# Altium footprint library ESKDPcbLib.PcbLib: 608 footprints (part 6 of 38)
Each footprint in its own frame and in the unit in brackets; x right, y up, seen from the top. Pads: shape width x height; smd on the part's side, far side on the other; paste and mask are expansions set on the pad; w line width, h text height; cw(c..) or ccw(c..) is an arc to the next point about the centre after c.
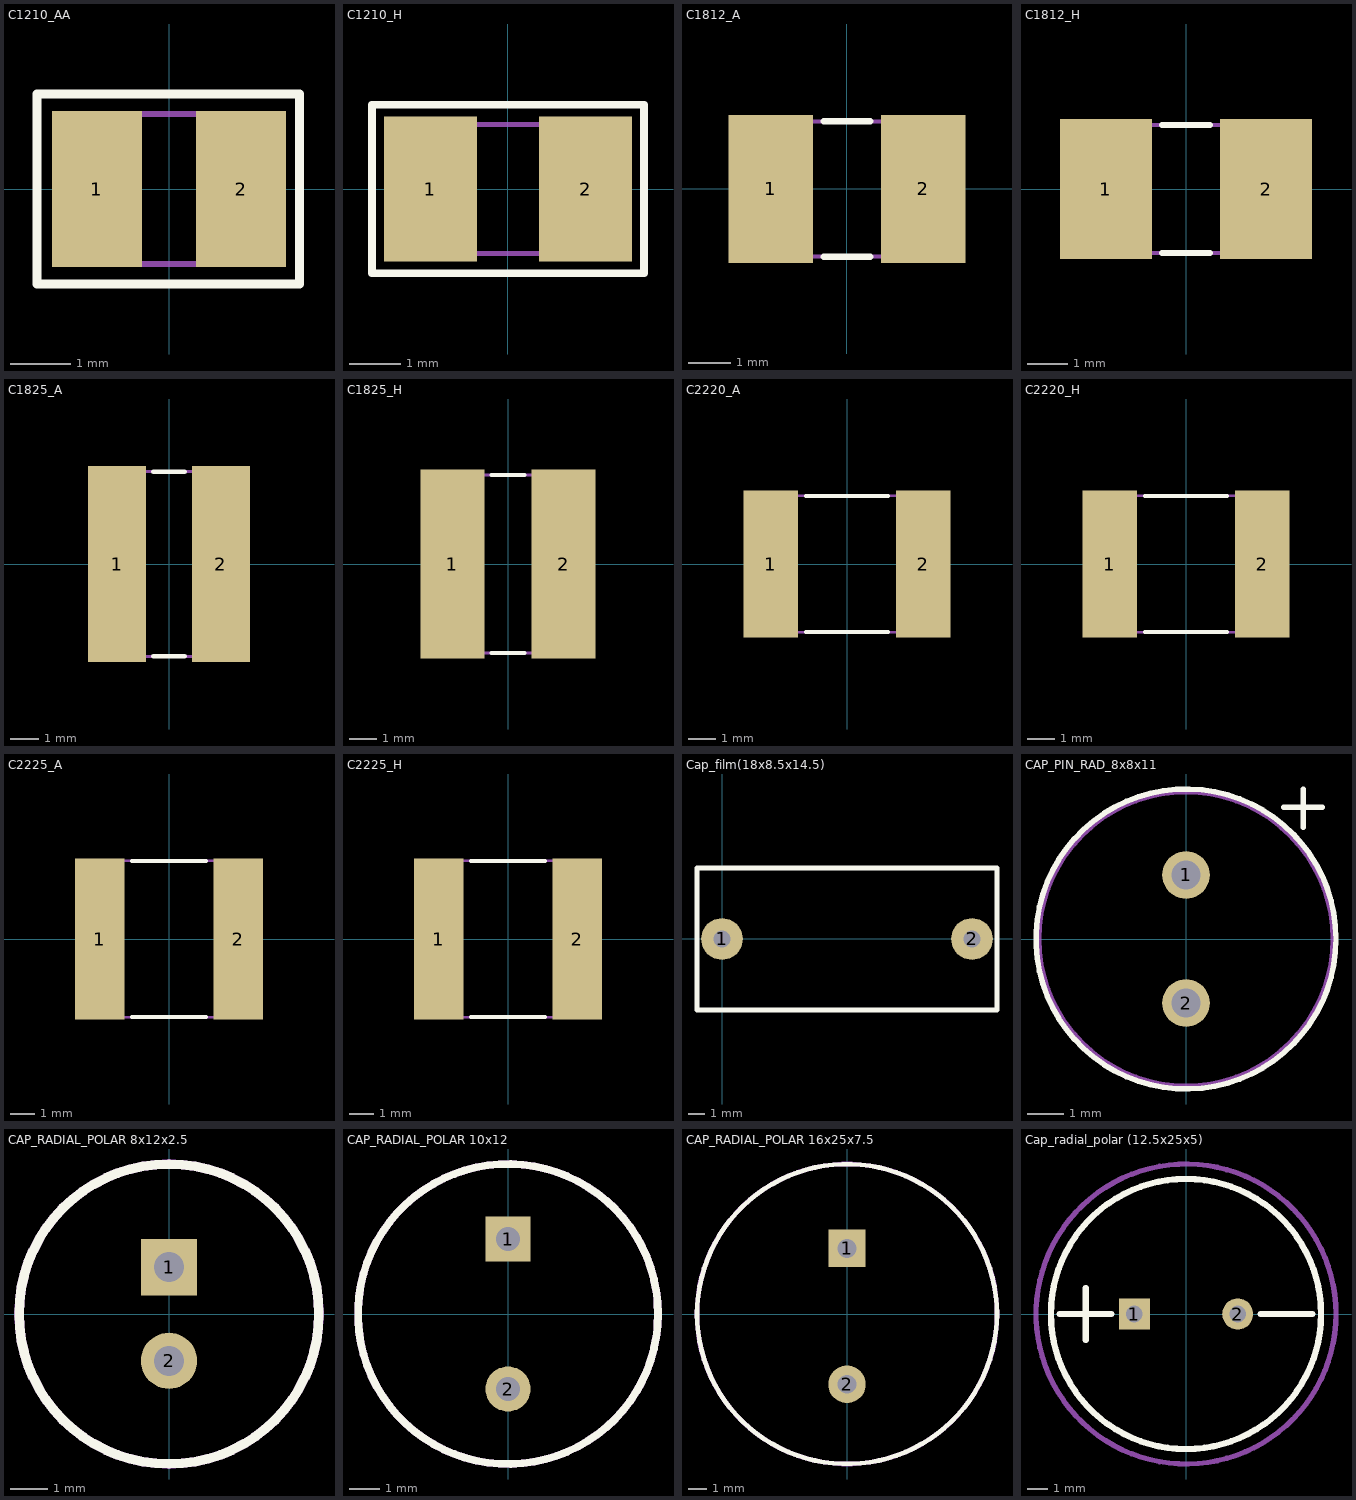
[diagram p5: the footprints below, top view; thin cyan lines are the x and y axes]

## C1210_AA [mm]
height 2.5
pads (2):
  rect 1.5x2.6 smd: 1(-1.2,0) 2(1.2,0)
Top Overlay:
  lines w0.15: -2.2,-1.58 2.175,-1.58 2.175,1.58 -2.2,1.58 -2.2,-1.58
Mechanical 7:
  lines w0.1: -1.6,-1.25 -1.6,1.25 1.6,1.25 1.6,-1.25 -1.6,-1.25
Mechanical 10:
  text ".Comment" at -0.74,-2.23 h0.6
  text ".Designator" at -0.71,1.89 h0.8
3D body: height 2.5, standoff 0, extent -1.6,-1.25 1.6,1.25

## C1210_H [mm]
height 2.5
pads (2):
  rect 1.8x2.8 smd: 1(-1.5,0) 2(1.5,0)
Top Overlay:
  lines w0.15: -2.63,-1.63 2.63,-1.63 2.63,1.63 -2.63,1.63 -2.63,-1.63
Mechanical 7:
  lines w0.1: -1.6,-1.25 -1.6,1.25 1.6,1.25 1.6,-1.25 -1.6,-1.25
Mechanical 10:
  text ".Comment" at -0.69,-2.29 h0.6
  text ".Designator" at -0.71,1.89 h0.8
3D body: height 2.5, standoff 0, extent -1.6,-1.25 1.6,1.25

## C1812_A [mm]
height 1.7
pads (2):
  rect 2x3.5 smd: 1(-1.8,0) 2(1.8,0)
Top Overlay:
  lines w0.15: -0.55,-1.6 0.55,-1.6 ; -0.55,1.6 0.55,1.6
Mechanical 7:
  lines w0.1: -2.25,-1.6 2.25,-1.6 2.25,1.6 -2.25,1.6 -2.25,-1.6
Mechanical 10:
  text ".Comment" at -0.52,-2.51 h0.6
  text ".Designator" at -0.62,2.14 h0.8
3D body "С1812.step": height 1, standoff 0, extent -2.25,-1.6 2.25,1.6

## C1812_H [mm]
height 1.7
pads (2):
  rect 2.3x3.5 smd: 1(-2,0) 2(2,0)
Top Overlay:
  lines w0.15: -0.6,-1.6 0.6,-1.6 ; -0.6,1.6 0.6,1.6
Mechanical 7:
  lines w0.1: -2.25,-1.6 -2.25,1.6 2.25,1.6 2.25,-1.6 -2.25,-1.6
Mechanical 10:
  text ".Comment" at -0.63,-2.52 h0.6
  text ".Designator" at -0.62,2.14 h0.8
3D body: height 1.7, standoff 0, extent -2.25,-1.6 2.25,1.6

## C1825_A [mm]
height 1.7
pads (2):
  rect 2x6.8 smd: 1(-1.8,0) 2(1.8,0)
Top Overlay:
  lines w0.15: -0.55,-3.2 0.55,-3.2 ; -0.55,3.2 0.55,3.2
Mechanical 7:
  lines w0.1: -2.25,-3.2 2.25,-3.2 2.25,3.2 -2.25,3.2 -2.25,-3.2
Mechanical 10:
  text ".Designator" at -0.69,3.88 h0.8
  text ".Comment" at -0.58,-4.11 h0.6
3D body "С1825.step": height 1.17, standoff 0.02, extent -2.25,-3.2 2.25,3.2

## C1825_H [mm]
height 1.7
pads (2):
  rect 2.3x6.8 smd: 1(-2,0) 2(2,0)
Top Overlay:
  lines w0.15: -0.6,-3.2 0.6,-3.2 ; -0.6,3.2 0.6,3.2
Mechanical 7:
  lines w0.1: -2.25,-3.2 -2.25,3.2 2.25,3.2 2.25,-3.2 -2.25,-3.2
Mechanical 10:
  text ".Comment" at -0.62,-4.23 h0.6
  text ".Designator" at -0.69,3.88 h0.8
3D body: height 1.7, standoff 0, extent -2.25,-3.2 2.25,3.2

## C2220_A [mm]
height 1.8
pads (2):
  rect 2x5.4 smd: 1(-2.8,0) 2(2.8,0)
Top Overlay:
  lines w0.15: -1.5,-2.5 1.5,-2.5 ; -1.5,2.5 1.5,2.5
Mechanical 7:
  lines w0.1: -2.8,-2.5 2.8,-2.5 2.8,2.5 -2.8,2.5 -2.8,-2.5
Mechanical 10:
  text ".Comment" at -0.5,-3.49 h0.6
  text ".Designator" at -0.56,3.04 h0.8
3D body "С2220.step": height 1.1, standoff 0.1, extent -2.8,-2.5 2.8,2.5

## C2220_H [mm]
height 1.8
pads (2):
  rect 2x5.4 smd: 1(-2.8,0) 2(2.8,0)
Top Overlay:
  lines w0.15: -1.5,-2.5 1.5,-2.5 ; -1.5,2.5 1.5,2.5
Mechanical 7:
  lines w0.1: -2.8,-2.5 -2.8,2.5 2.8,2.5 2.8,-2.5 -2.8,-2.5
Mechanical 10:
  text ".Designator" at -0.56,3.04 h0.8
  text ".Comment" at -0.47,-3.45 h0.6
3D body: height 1.8, standoff 0, extent -2.8,-2.5 2.8,2.5

## C2225_A [mm]
height 2
pads (2):
  rect 2x6.5 smd: 1(-2.8,0) 2(2.8,0)
Top Overlay:
  lines w0.15: -1.5,-3.15 1.5,-3.15 ; -1.5,3.15 1.5,3.15
Mechanical 7:
  lines w0.1: -2.8,-3.15 -2.8,3.15 2.8,3.15 2.8,-3.15 -2.8,-3.15
Mechanical 10:
  text ".Comment" at -0.46,-4 h0.6
  text ".Designator" at -0.59,3.58 h0.8
3D body "С2225.step": height 1.1, standoff 0.1, extent -2.8,-3.15 2.8,3.15

## C2225_H [mm]
height 2
pads (2):
  rect 2x6.5 smd: 1(-2.8,0) 2(2.8,0)
Top Overlay:
  lines w0.15: -1.5,-3.15 1.5,-3.15 ; -1.5,3.15 1.5,3.15
Mechanical 7:
  lines w0.1: -2.8,-3.15 -2.8,3.15 2.8,3.15 2.8,-3.15 -2.8,-3.15
Mechanical 10:
  text ".Designator" at -0.59,3.58 h0.8
  text ".Comment" at -0.42,-3.91 h0.6
3D body: height 2, standoff 0, extent -2.8,-3.15 2.8,3.15

## Cap_film(18x8.5x14.5) [mm] "18x8.5x14.5"
height 14.5
pads (2):
  round 2.5 hole 1: 1(0,0) 2(15,0)
Top Overlay:
  lines w0.3: -1.5,-4.25 -1.5,4.25 16.5,4.25 16.5,-4.25 -1.5,-4.25
Mechanical 7:
  lines w0.15: -1.5,-4.25 16.5,-4.25 16.5,4.25 -1.5,4.25 -1.5,-4.25
3D body: height 16.3, standoff -3.7, extent -2,-4 17,4

## CAP_PIN_RAD_8x8x11 [mm]
pads (2):
  round 1.3 hole 0.8: 1(0,1.75) 2(0,-1.75)
Top Overlay:
  circle w0.15: c0,0 r4.1
  lines w0.15: 2.675,3.6 3.725,3.6 ; 3.2,3.05 3.2,4.1
Mechanical 7:
  circle w0.1: c0,0 r4
Mechanical 9:
  circle w0.1: c0,0 r4
Mechanical 10:
  text ".Designator" at 0.75,4.75 h0.8
  text ".Comment" at 1,-4.75 h0.6
3D body: height 12, standoff 0.5, extent -3.968,-3.992 4,3.992

## CAP_RADIAL_POLAR 8x12x2.5 [mm]
pads (2):
  rect 1.5x1.5 hole 0.8: 1(0,1.25)
  round 1.5 hole 0.8: 2(0,-1.25)
Top Overlay:
  circle w0.254: c0,0 r4
Mechanical 7:
  circle w0.254: c0,0 r4.001
Mechanical 10:
  text ".Designator" at 4.3,2.7 h1
  text ".Comment" at 4.3,1.7 h1
3D body "CAP 8x12x2.5.STEP": height 12.12, standoff -10, extent -4.06,-4.06 4.06,4.06

## CAP_RADIAL_POLAR 10x12 [mm]
pads (2):
  rect 1.5x1.5 hole 0.8: 1(0,2.5)
  round 1.5 hole 0.8: 2(0,-2.5)
Top Overlay:
  circle w0.254: c0,0 r5
Mechanical 7:
  circle w0.254: c0,0 r5
Mechanical 10:
  text ".Comment" at 5.3,1.7 h1
  text ".Designator" at 5.3,2.7 h1
3D body "CAPACITOR RADIAL 10X12.STEP": height 12, standoff -2.5, extent -5,-5 5,5

## CAP_RADIAL_POLAR 16x25x7.5 [mm]
pads (2):
  rect 2x2 hole 1: 1(0,3.5)
  round 2 hole 1: 2(0,-3.75)
Top Overlay:
  circle w0.254: c0,0 r8
Mechanical 7:
  circle w0.254: c0,0 r8.004
Mechanical 10:
  text ".Designator" at 8.475,2.725 h1
  text ".Comment" at 8.475,1.725 h1
3D body "Cap16x25x7.5.STEP": height 25, standoff -19, extent -8,-8.25 8,7.75

## Cap_radial_polar (12.5x25x5) [mm] "12.5x25x5"
height 25
pads (2):
  rect 1.5x1.5 hole 0.8: 1(-2.5,0)
  round 1.5 hole 0.8: 2(2.5,0)
Top Overlay:
  circle w0.3: c0,0 r6.53
  lines w0.3: -6.1,0 -3.6,0 ; -4.85,-1.25 -4.85,1.25 ; 3.6,0 6.1,0
Mechanical 7:
  circle w0.254: c0,0 r7.25